# Altium footprint library ThanhNT.PcbLib: 579 footprints (part 18 of 37)
Each footprint in its own frame and in the unit in brackets; x right, y up, seen from the top. Pads: shape width x height; smd on the part's side, far side on the other; paste and mask are expansions set on the pad; w line width, h text height; cw(c..) or ccw(c..) is an arc to the next point about the centre after c.
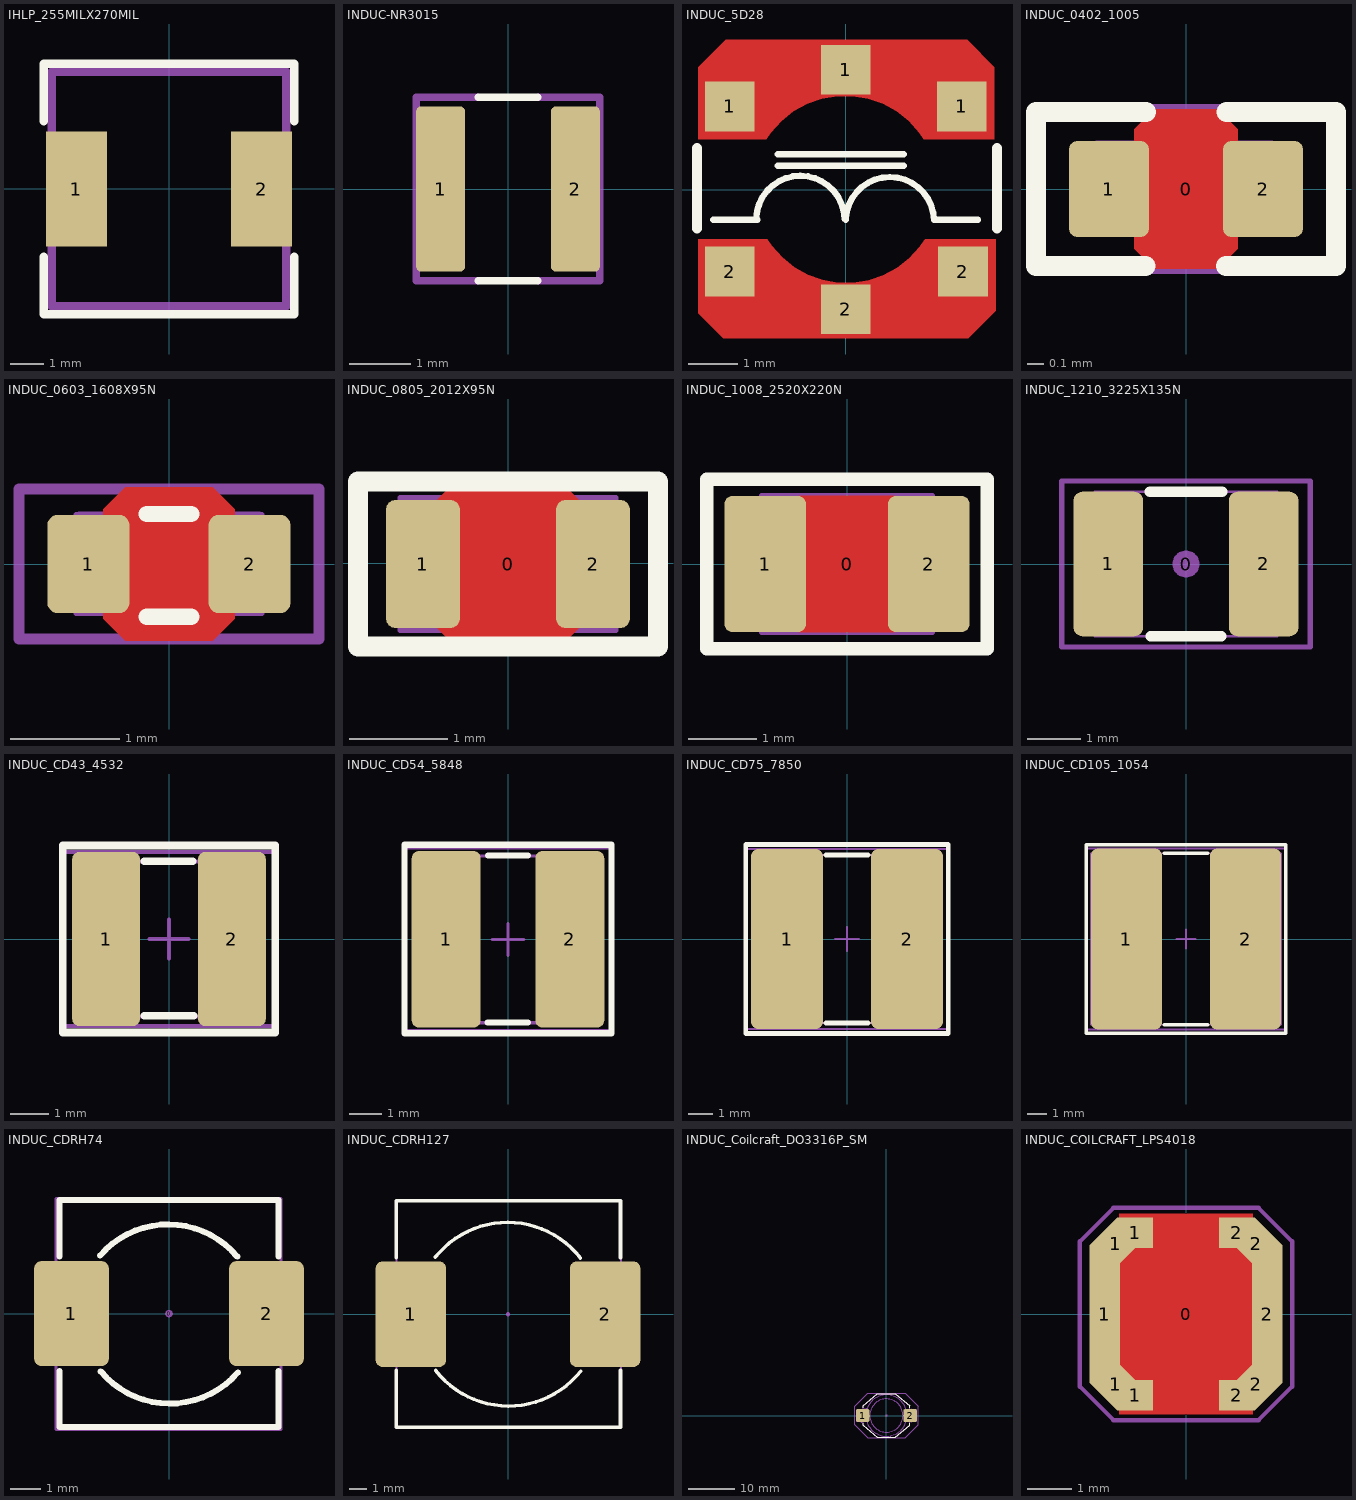
[diagram p17: the footprints below, top view; thin cyan lines are the x and y axes]

## IHLP_255MILX270MIL [mil]
pads (2):
  rect 72x135 smd: 1(-109.02,0) 2(108.98,0)
Top Overlay:
  lines w10: -147.66,-80 -147.66,-147.64 147.62,-147.64 147.62,-80 ; -147.66,80 -147.66,147.63 147.62,147.63 147.62,80
Mechanical 16:
  lines w10: -137.82,-137.8 -137.82,137.79 137.77,137.79 137.77,-137.8 -137.82,-137.8
3D body: height 78.74, standoff 0, extent 119.32,-62.92 135.07,63.06
3D body: height 78.74, standoff 0, extent -134.95,-62.92 -119.21,63.06
3D body: height 118.11, standoff 0, extent -119.27,-106.43 -95.56,106.57
3D body: height 118.11, standoff 0, extent 95.61,-106.43 119.32,106.57
3D body: height 118.11, standoff 0, extent 72.17,-130 119.23,-82.85
3D body: height 118.11, standoff 0, extent 72.17,82.94 119.32,130
3D body: height 118.11, standoff 0, extent -119.27,82.94 -72.12,130
3D body: height 118.11, standoff 0, extent -119.27,-130 -72.21,-82.85
3D body: height 118.11, standoff 0, extent -95.74,-130 95.75,130

## INDUC-NR3015 [mil]
pads (2):
  rrect20% 31.5x106.3 smd: 1(-43.31,0) 2(43.31,0)
Top Overlay:
  lines w5: -19.06,-59.06 19.06,-59.06 ; -19.06,59.06 19.06,59.06
Mechanical 16:
  lines w5: -19.69,-59.06 -59.06,-59.06 -59.06,59.06 -19.69,59.06 ; 19.69,-59.06 59.06,-59.06 59.06,59.06 19.69,59.06
3D body "User Library-nr3015.STEP": height 53.15, standoff -5.36, extent -59.05,-59.05 59.06,59.06

## INDUC_5D28 [mm]
pads (6):
  rect 1x1 smd: 1(-2.337,1.676) 1(0,2.413) 1(2.337,1.676) 2(-2.337,-1.651) 2(0,-2.413) 2(2.362,-1.651)
Top Layer:
  region: -2.972,1.016 -2.972,2.47 -2.419,3.023 2.444,3.023 2.997,2.47 2.997,1.016 1.575,1.016 1.485,1.146 1.275,1.38 1.029,1.577 0.753,1.729 0.455,1.833 0.145,1.886 -0.17,1.886 -0.481,1.833 -0.778,1.729 -1.054,1.577 -1.3,1.38 -1.511,1.146 -1.6,1.016
  region: -2.464,-2.997 -2.972,-2.489 -2.972,-1 -1.6,-1 -1.578,-1.002 -1.489,-1.131 -1.282,-1.366 -1.038,-1.562 -0.765,-1.716 -0.469,-1.821 -0.161,-1.875 0.152,-1.877 0.462,-1.826 0.758,-1.725 1.033,-1.575 1.279,-1.381 1.49,-1.149 1.579,-1.021 1.6,-1 3.023,-1 3.023,-2.438 2.464,-2.997
Top Overlay:
  lines w0.127: -2.667,-0.61 -1.778,-0.61 ; -1.803,-0.584 cw(c-0.914,-0.61) -0.025,-0.585 ; -1.372,0.483 1.168,0.483 ; -1.372,0.711 1.168,0.711 ; 0,-0.61 cw(c0.889,-0.635) 1.778,-0.61 ; 1.778,-0.61 2.667,-0.61
  lines w0.2: -2.997,-0.787 -2.997,0.838 ; 3.048,-0.787 3.048,0.838
3D body "User Library-cdrh5d28.STEP": height 3.01, standoff 0.01, extent -2.977,-3 3.023,3

## INDUC_0402_1005 [mm]
pads (3):
  round 0.2 on Mech15: 0(0,0)
  rrect20% 0.5x0.6 smd: 1(-0.483,0) 2(0.483,0)
Top Layer:
  pour cut-out: -0.325,0.375 -0.2,0.5 0.2,0.5 0.325,0.375 0.325,-0.375 0.2,-0.5 -0.2,-0.5 -0.325,-0.375
Top Overlay:
  lines w0.127: -0.254,-0.483 -0.94,-0.483 -0.94,0.483 -0.25,0.483 ; 0.25,-0.483 0.94,-0.483 0.94,0.483 0.254,0.483
Mechanical 13:
  lines w0.05: 0.225,-0.274 -0.225,-0.274 0.225,-0.274 ; -0.525,-0.275 -0.225,-0.275 -0.225,0.275 -0.525,0.275 -0.525,-0.275 ; -0.225,0.274 0.225,0.274 -0.225,0.274 ; 0.225,-0.275 0.225,0.275 0.525,0.275 0.525,-0.275 0.225,-0.275
Mechanical 15:
  lines w0.1: -0.94,-0.483 0.94,-0.483 0.94,0.483 -0.94,0.483 -0.94,-0.483
Mechanical 16:
  rectangle: 0.246,-0.295 0.546,0.305
  rectangle: -0.567,-0.295 -0.267,0.305
  lines w0.152: -0.258,-0.214 0.232,-0.214 ; -0.258,0.234 0.232,0.234
3D body "User Library-SMD RESISTOR-10402.STEP": height 0.36, standoff 0.01, extent -0.5,-0.25 0.5,0.25

## INDUC_0603_1608X95N [mm] "Chip bead, Body 1.6x0.8mm, 0603, IPC Medium Density"
height 0.8
pads (2):
  rrect25% 0.75x0.9 smd: 1(-0.737,0) 2(0.737,0)
Top Layer:
  pour cut-out: -0.6,0.5 -0.4,0.7 0.4,0.7 0.6,0.5 0.6,-0.5 0.4,-0.7 -0.4,-0.7 -0.6,-0.5
Top Overlay:
  lines w0.15: -0.203,-0.483 0.203,-0.483 ; -0.203,0.457 0.203,0.457
Mechanical 13:
  lines w0.05: -0.55,-0.43 0.55,-0.43 ; -0.55,0.43 0.55,0.43 ; -0.85,-0.45 -0.85,0.45 -0.55,0.45 -0.55,-0.45 -0.85,-0.45 ; 0.55,-0.45 0.55,0.45 0.85,0.45 0.85,-0.45 0.55,-0.45
Mechanical 15:
  lines w0.1: -1.372,-0.686 -1.372,0.686 1.372,0.686 1.372,-0.686 -1.372,-0.686
Mechanical 16:
  rectangle: 0.336,-0.472 0.836,0.478
  rectangle: -0.832,-0.472 -0.332,0.478
  lines w0.102: -0.35,-0.421 0.362,-0.421 ; -0.35,0.43 0.362,0.43
3D body "User Library-Chip InductorINDC1608X95N.STEP": height 0.96, standoff 0.01, extent -0.8,-0.4 0.8,0.4

## INDUC_0805_2012X95N [mm] "Inductor SMD 0805, 2mmx1.2mm"
height 0.95
pads (3):
  round 0.254 on Mech15: 0(0,-0.01)
  rrect25% 0.75x1.3 smd: 1(-0.864,-0.01) 2(0.864,-0.01)
Top Layer:
  pour cut-out: -0.725,0.64 -0.525,0.84 0.525,0.84 0.725,0.64 0.725,-0.66 0.525,-0.86 -0.525,-0.86 -0.725,-0.66
Top Overlay:
  lines w0.2: -1.524,-0.848 -1.524,0.828 1.524,0.828 1.524,-0.848 -1.524,-0.848
Mechanical 13:
  lines w0.05: 0.6,-0.684 -0.6,-0.684 ; -0.6,-0.684 0.6,-0.684 ; -0.6,-0.685 -1.1,-0.685 -1.1,0.665 -0.6,0.665 -0.6,-0.685 ; 0.6,-0.685 1.1,-0.685 1.1,0.665 0.6,0.665 0.6,-0.685 ; -0.6,0.664 0.6,0.664 -0.6,0.664
Mechanical 15:
  lines w0.1: -1.524,-0.86 1.524,-0.86 1.524,0.84 -1.524,0.84 -1.524,-0.86
3D body "User Library-Chip InductorINDC2012X95N.STEP": height 0.96, standoff 0.01, extent -1,-0.6 1,0.6

## INDUC_1008_2520X220N [mm] "Inductor, molded body 2.5x2.0mm"
height 1.9
pads (3):
  round 0.508 on Mech15: 0(0,0)
  rrect20% 1.2x2 smd: 1(-1.2,0) 2(1.2,0)
Top Layer:
  pour cut-out: -0.7,1 0.7,1 0.7,-1 -0.7,-1
Top Overlay:
  lines w0.2: -2.057,-1.245 2.057,-1.245 2.057,1.245 -2.057,1.245 -2.057,-1.245
Mechanical 13:
  lines w0.076: -1.25,-1 -1.25,1 1.25,1 1.25,-1 -1.25,-1
Mechanical 15:
  lines w0.1: -2.057,-1.245 2.057,-1.245 2.057,1.245
  lines w0.127: -2.057,-1.245 -2.057,1.245 2.057,1.245
3D body "User Library-Chip InductorINDC2520X220N.STEP": height 2.21, standoff 0.01, extent -1.25,-1 1.25,1

## INDUC_1210_3225X135N [mm] "Inductor SMD 1206, 3.2mmx2.5mm"
height 1.35
pads (3):
  round 0.508 on Mech15: 0(0,0)
  rrect25% 1.3x2.7 smd: 1(-1.45,0) 2(1.45,0)
Top Overlay:
  lines w0.2: -0.67,1.35 0.67,1.35 ; -0.66,-1.35 0.66,-1.35
Mechanical 13:
  lines w0.05: -1.7,-1.35 -1.7,1.35 -1.1,1.35 -1.1,-1.35 -1.7,-1.35 ; -1.1,-1.349 1.1,-1.349 -1.1,-1.349 ; -1.1,1.349 1.1,1.349 -1.1,1.349 ; 1.1,-1.35 1.7,-1.35 1.7,1.35 1.1,1.35 1.1,-1.35
Mechanical 15:
  lines w0.1: -2.32,-1.55 2.32,-1.55 2.32,1.55 -2.32,1.55 -2.32,-1.55
3D body "User Library-Chip InductorINDC3225X135N.STEP": height 1.36, standoff 0.01, extent -1.6,-1.25 1.6,1.25

## INDUC_CD43_4532 [mm]
pads (2):
  rrect20% 1.75x4.5 smd: 1(-1.625,0) 2(1.625,0)
Top Overlay:
  lines w0.2: -0.635,-1.981 0.635,-1.981 ; -0.635,2.007 0.61,2.007 ; -2.743,-2.413 2.743,-2.413 2.743,2.413 -2.743,2.413 -2.743,-2.413
Mechanical 13:
  lines w0.1: -2.25,-2 -2.25,2 2.25,2 2.25,-2 -2.25,-2
Mechanical 15:
  lines w0.1: -0.5,0 0.5,0 ; 0,-0.5 0,0.5 ; -2.743,-2.25 -2.743,2.25 2.743,2.25 2.743,-2.25 -2.743,-2.25
3D body "744773014.stp": height 3.17, standoff -0.01, extent -2.231,-2 2.231,2

## INDUC_CD54_5848 [mm]
pads (2):
  rrect20% 2.15x5.5 smd: 1(-1.925,0) 2(1.925,0)
Top Overlay:
  lines w0.2: -0.635,-2.591 0.61,-2.591 ; -0.61,2.616 0.61,2.616 ; -3.226,-2.921 -3.226,2.946 3.226,2.946 3.226,-2.921 -3.226,-2.921
Mechanical 13:
  lines w0.1: -2.9,-2.6 -2.9,2.6 2.9,2.6 2.9,-2.6 -2.9,-2.6
Mechanical 15:
  lines w0.1: -0.5,0 0.5,0 ; 0,-0.5 0,0.5 ; -3.226,-2.85 -3.226,2.85 3.226,2.85 3.226,-2.85 -3.226,-2.85
3D body "744774003.stp": height 4.49, standoff -0.01, extent -2.894,-2.6 2.894,2.6

## INDUC_CD75_7850 [mm]
pads (2):
  rrect20% 3x7.5 smd: 1(-2.5,0) 2(2.5,0)
Top Overlay:
  lines w0.2: -0.875,-3.5 0.875,-3.5 ; -0.875,3.5 0.875,3.5 ; -4.216,-3.937 -4.216,3.937 4.216,3.937 4.216,-3.937 -4.216,-3.937
Mechanical 13:
  lines w0.1: -3.9,-3.5 -3.9,3.5 3.9,3.5 3.9,-3.5 -3.9,-3.5
Mechanical 15:
  lines w0.1: -0.5,0 0.5,0 ; 0,-0.5 0,0.5 ; -4.216,-3.75 -4.216,3.75 4.216,3.75 4.216,-3.75 -4.216,-3.75
3D body "74477510.stp": height 4.89, standoff -0.01, extent -3.813,-3.5 3.813,3.5

## INDUC_CD105_1054 [mm]
pads (2):
  rrect20% 3.75x9.5 smd: 1(-3.125,0) 2(3.125,0)
Top Overlay:
  lines w0.2: -1.125,-4.5 1.125,-4.5 ; -1.125,4.5 1.125,4.5 ; -5.232,-4.953 -5.232,4.953 5.232,4.953 5.232,-4.953 -5.232,-4.953
Mechanical 13:
  lines w0.1: -5,-4.5 -5,4.5 5,4.5 5,-4.5 -5,-4.5
Mechanical 15:
  lines w0.1: -0.5,0 0.5,0 ; 0,-0.5 0,0.5 ; -5.232,-4.75 -5.232,4.75 5.258,4.75 5.258,-4.75 -5.232,-4.75
3D body "WE-PD2_HV_1054.stp": height 5.4, standoff 0, extent -4.957,-4.474 4.906,4.527

## INDUC_CDRH74 [mm] "Inductor SMD 7x7x4mm Hand Solder"
pads (3):
  round 0.254 on Mech15: 0(0,0)
  rrect20% 2.5x3.5 smd: 1(-3.25,0) 2(3.25,0)
Top Overlay:
  lines w0.2: -3.658,-1.905 -3.658,-3.785 3.658,-3.785 3.658,-1.905 ; -3.658,1.905 -3.658,3.785 3.658,3.785 3.658,1.905 ; -2.294,1.937 cw(c-0.025,-0.025) 2.277,1.898 ; -2.277,-1.923 ccw(c0.025,0) 2.294,-1.963
Mechanical 15:
  lines w0.1: -3.759,-3.861 3.734,-3.861 3.734,3.835 -3.759,3.835 -3.759,-3.861
3D body "User Library-CDRH74NP-220MC.STEP": height 4.5, standoff 0, extent -3.65,-3.65 3.65,3.65

## INDUC_CDRH127 [mm] "Inductor SMD 12x12 Hand Solder"
pads (3):
  round 0.254 on Mech15: 0(0,0)
  rrect20% 4x6 smd: 1(-5.5,0) 2(5.5,0)
Top Overlay:
  lines w0.2: -6.325,-3.175 -6.325,-6.401 6.375,-6.401 6.375,-3.175 ; -6.325,3.2 -6.325,6.426 6.375,6.426 6.375,3.2 ; -4.128,3.218 cw(c-0.025,-0.025) 4.103,3.186 ; -4.103,-3.186 ccw(c0.025,0.025) 4.128,-3.218
Mechanical 15:
  lines w0.1: -6.325,-6.401 6.401,-6.401 6.401,6.401 -6.325,6.401 -6.325,-6.401
3D body "User Library-Inductor SRR1280 Series.STEP": height 7.51, standoff 0, extent -6.25,-6.25 6.25,6.25

## INDUC_Coilcraft_DO3316P_SM [mil] "Wire-wound Power Inductor, 2-Leads, Body 12.95x9.4mm"
height 205
pads (3):
  round 20 on Mech15: 0(0,0)
  rrect25% 115x110 smd: 1(-202.5,0) 2(202.5,0)
Top Overlay:
  lines w7.87: -200,-65 -200,-82.84 -76.63,-185 76.63,-185 200,-82.84 200,-65 ; -200,65 -200,82.84 -76.63,185 76.63,185 200,82.84 200,65
Mechanical 13:
  drawing of 272 lines, arcs and shapes, not listed
Mechanical 15:
  lines w3: -270,-80 -270,80 -160,190 160,190 270,80 270,-80 160,-190 -160,-190 -270,-80
3D body "Pulse Inductor RR.STEP": height 172.5, standoff 0, extent -255.38,-185 255.2,185

## INDUC_COILCRAFT_LPS4018 [mm] "Shielded Power Inductor, Body 4.0x4.0x1.8mm"
height 1.8
pads (11):
  round 0.5 on Mech15: 0(0,0)
  rrect1% 0.7x3.124 smd: 1(-1.85,0) 2(1.85,0)
  rrect1% 0.786x0.902 smd rot 45: 1(-1.603,-1.603) 2(1.603,1.603)
  rrect1% 0.786x0.902 smd rot 135: 1(-1.603,1.603) 2(1.603,-1.603)
  rrect1% 0.812x0.7 smd: 1(-1.156,-1.85) 1(-1.156,1.85) 2(1.156,-1.85) 2(1.156,1.85)
Top Layer:
  pour cut-out: -1.524,2.286 1.524,2.286 1.524,-2.286 -1.524,-2.286
Mechanical 13:
  lines w0.076: -2,-1.275 -1.275,-2 1.275,-2 2,-1.275 2,1.325 1.325,2 -1.325,2 -2,1.325 -2,-1.275
Mechanical 15:
  lines w0.1: -2.413,-1.651 -2.413,1.651 -1.651,2.413 1.651,2.413 2.413,1.651 2.413,-1.651 1.651,-2.413 -1.651,-2.413 -2.413,-1.651
3D body "Inductor Coilcraft LPS4018.STEP": height 1.79, standoff -0.01, extent -2,-2 2,2